# Altium footprint library CM3Board.PcbLib: 127 footprints (part 2 of 8)
Each footprint in its own frame and in the unit in brackets; x right, y up, seen from the top. Pads: shape width x height; smd on the part's side, far side on the other; paste and mask are expansions set on the pad; w line width, h text height; cw(c..) or ccw(c..) is an arc to the next point about the centre after c.
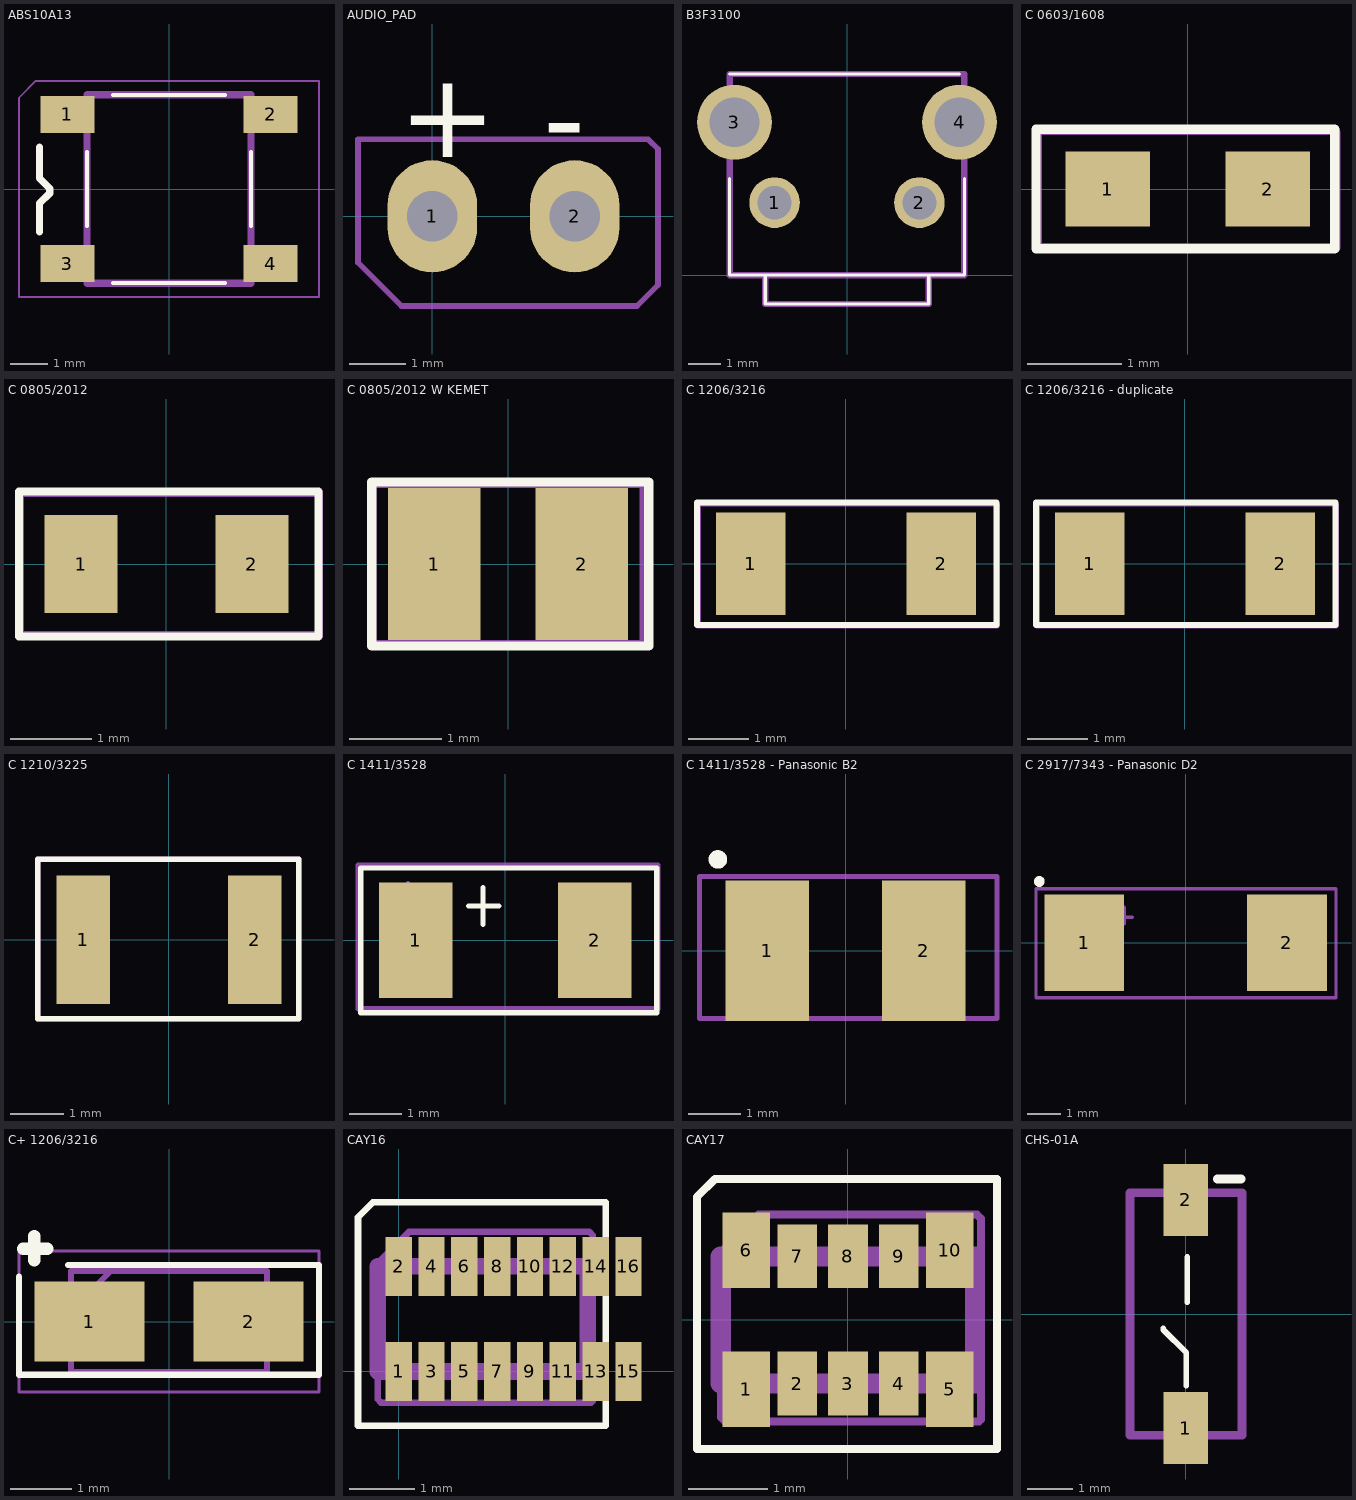
[diagram p1: the footprints below, top view; thin cyan lines are the x and y axes]

## ABS10A13 [mm]
pads (4):
  rect 1.45x1 smd: 1(-2.725,2) 2(2.725,2) 3(-2.725,-2) 4(2.725,-2)
Top Overlay:
  lines w0.1: -2.2,-1 -2.2,1 ; -1.5,-2.525 1.5,-2.525 ; -1.5,2.525 1.5,2.525 ; 2.2,-1 2.2,1
  lines w0.2: -3.475,-1.15 -3.475,-0.387 -3.2,-0.113 -3.2,0.013 -3.475,0.288 -3.475,1.125
Mechanical 13:
  lines w0.2: -2.2,-2.525 2.2,-2.525 2.2,2.525 -2.2,2.525 -2.2,-2.525
Mechanical 29:
  lines w0.05: -4.025,-2.9 -4.025,2.45 -3.575,2.9 4.025,2.9 4.025,-2.9 -4.025,-2.9
  text ".Designator" at -0.75,-0.025 h1

## AUDIO_PAD [mm]
pads (2):
  oval 1.6x2 hole 0.9: 1(0,0) 2(2.54,0)
Top Overlay:
  text "-" at 1.975,1 h1.52
  text "+" at -0.6,1.05 h1.52
Mechanical 29:
  lines w0.1: -1.325,-0.825 -1.325,1.375 3.85,1.375 4.025,1.2 4.025,-1.225 3.65,-1.6 -0.55,-1.6 -1.325,-0.825
  text ".Designator" at 0.425,-0.375 h1

## B3F3100 [mm]
pads (4):
  round 1.575 hole 1.05: 1(-2.25,2.25) 2(2.25,2.25)
  round 2.325 hole 1.55: 3(-3.5,4.75) 4(3.5,4.75)
Top Overlay:
  lines w0.1: -3.65,3 -3.65,0 3.65,0 3.65,3 ; -3.65,6.25 3.5,6.25 ; -2.54,0 -2.54,-0.9 2.54,-0.9 2.54,0
Mechanical 29:
  lines w0.2: -2.54,0 -2.54,-0.9 2.25,-0.9 2.54,-0.9 2.54,0 ; -3.65,0 -3.65,6.25 3.65,6.25 3.65,0 -3.65,0
  text ".Designator" at -1.016,2.286 h1
3D body "B3F-3100.stp": height 7.4, standoff -3.5, extent -4.223,-0.889 4.477,6.261

## C 0603/1608 [mm]
pads (2):
  rect 0.9x0.8 smd: 1(-0.85,0) 2(0.85,0)
Top Overlay:
  lines w0.1: -1.612,-0.635 1.563,-0.635 1.563,0.635 -1.612,0.635 -1.612,-0.635
Mechanical 29:
  lines w0.1: -1.6,-0.625 1.575,-0.625 1.575,0.6 1.55,0.625 -1.6,0.625 -1.6,-0.625
  text ".Designator" at -1.4,-0.4 h0.8
3D body: height 0.64, standoff 0, extent 0.85,-0.4 1.3,0.4
3D body: height 0.64, standoff 0, extent -1.3,-0.4 -0.85,0.4
3D body: height 0.64, standoff 0, extent -0.85,-0.4 0.85,0.4

## C 0805/2012 [mm]
pads (2):
  rect 0.9x1.2 smd: 1(-1.05,0) 2(1.05,0)
Top Overlay:
  lines w0.1: -1.812,-0.889 -1.812,0.889 1.871,0.889 1.871,-0.889 -1.812,-0.889
Mechanical 29:
  lines w0.1: -1.8,-0.875 -1.8,0.85 -1.775,0.875 1.875,0.875 1.875,-0.875 -1.8,-0.875
  text ".Designator" at -1.675,-0.55 h1
3D body: height 0.64, standoff 0, extent 1.1,-0.6 1.5,0.6
3D body: height 0.64, standoff 0, extent -1.5,-0.6 -1.05,0.6
3D body: height 0.64, standoff 0, extent -1.05,-0.6 1.1,0.6

## C 0805/2012 W KEMET [mm] "C0805C103K5RACTU"
pads (2):
  rect 1x1.65 smd: 1(-0.8,0) 2(0.8,0)
Top Overlay:
  lines w0.1: -1.475,-0.889 -1.475,0.889 1.525,0.889 1.525,-0.889 -1.475,-0.889
Mechanical 29:
  lines w0.1: -1.475,-0.875 -1.475,0.875 ; -1.475,-0.875 -1.475,0.875 ; -1.475,-0.875 1.475,-0.875 1.475,0.875 -1.475,0.875
  text ".Designator" at -1.15,-0.6 h1
3D body "C0805C103K5RACTU.step": height 0.88, standoff 0, extent -1.1,-0.775 1.1,0.675

## C 1206/3216 [mm]
pads (2):
  rect 1.15x1.7 smd: 1(-1.575,0) 2(1.575,0)
Top Overlay:
  lines w0.1: -2.464,-1.016 -2.464,1.016 2.489,1.016 2.489,-1.016 -2.464,-1.016
Mechanical 29:
  lines w0.1: -2.45,-1.025 -2.45,1 2.475,1 2.5,0.975 2.5,-1.025 -2.425,-1.025 -2.45,-1.025
  text ".Designator" at -2.225,-0.825 h1
3D body: height 0.64, standoff 0, extent -1.55,-0.85 1.65,0.85
3D body: height 0.64, standoff 0, extent -2.15,-0.85 -1.55,0.85
3D body: height 0.64, standoff 0, extent 1.65,-0.85 2.15,0.85

## C 1206/3216 - duplicate [mm]
pads (2):
  rect 1.15x1.7 smd: 1(-1.575,0) 2(1.575,0)
Top Overlay:
  lines w0.1: -2.464,-1.016 -2.464,1.016 2.489,1.016 2.489,-1.016 -2.464,-1.016
Mechanical 29:
  lines w0.1: -2.45,-1.025 -2.45,1 2.475,1 2.5,0.975 2.5,-1.025 -2.425,-1.025 -2.45,-1.025
  text ".Designator" at -2.225,-0.825 h1
3D body: height 0.64, standoff 0, extent -1.55,-0.85 1.65,0.85
3D body: height 0.64, standoff 0, extent -2.15,-0.85 -1.55,0.85
3D body: height 0.64, standoff 0, extent 1.65,-0.85 2.15,0.85

## C 1210/3225 [mm]
pads (2):
  rect 1x2.4 smd: 1(-1.6,0) 2(1.6,0)
Top Overlay:
  lines w0.1: -2.45,-1.475 2.425,-1.475 2.425,1.5 -2.45,1.5 -2.45,-1.475
Mechanical 29:
  lines w0.1: -2.45,-1.475 2.425,-1.475 2.425,1.5 -2.45,1.5 -2.45,-1.475
  text ".Designator" at -2.175,-0.9 h1
3D body: height 0.64, standoff 0, extent -2.1,-1.2 -1.575,1.2
3D body: height 0.64, standoff 0, extent 1.625,-1.2 2.1,1.2
3D body: height 0.64, standoff 0, extent -1.575,-1.2 1.625,1.2

## C 1411/3528 [mm]
pads (2):
  rect 1.4x2.2 smd: 1(-1.7,0) 2(1.7,0)
Top Overlay:
  lines w0.1: -0.7,0.65 -0.125,0.65 ; -0.425,0.3 -0.425,1 ; -2.75,-1.375 -2.75,1.375 2.875,1.375 2.875,-1.375 -2.75,-1.375
Mechanical 29:
  lines w0.1: -2.05,0.775 -1.6,0.775 ; -1.85,0.575 -1.85,1.075 ; -2.8,-1.3 -2.8,1.425 2.9,1.425 2.9,-1.3 -2.8,-1.3
  text ".Designator" at -1.55,-0.5 h1
3D body "T520B227M006ATE045.step": height 2.11, standoff 0.01, extent -1.875,-1.525 1.825,1.475

## C 1411/3528 - Panasonic B2 [mm]
pads (2):
  rect 1.6x2.7 smd: 1(-1.5,0) 2(1.5,0)
Top Overlay:
  circle w0.254: c-2.45,1.75 r0.05
Mechanical 29:
  lines w0.1: -2.05,0.775 -1.6,0.775 ; -1.85,0.575 -1.85,1.075 ; -2.8,-1.3 2.9,-1.3 2.9,1.425 -2.8,1.425 -2.8,-1.3
  text ".Designator" at -1.55,-0.5 h1
3D body "T520B227M006ATE045.step": height 2.11, standoff 0.01, extent -1.875,-1.525 1.825,1.475

## C 2917/7343 - Panasonic D2 [mm]
pads (2):
  rect 2.4x2.9 smd: 1(-3.05,0) 2(3.05,0)
Top Overlay:
  circle w0.254: c-4.4,1.85 r0.035
Mechanical 29:
  lines w0.1: -2.05,0.775 -1.6,0.775 ; -1.85,0.575 -1.85,1.075 ; -4.5,-1.65 4.525,-1.65 4.525,1.625 -4.5,1.625 -4.5,-1.65
  text ".Designator" at -1.55,-0.5 h1
3D body: height 0.64, standoff 0, extent -3.95,-1.4 -2.475,1.4
3D body: height 0.64, standoff 0, extent -2.475,-1.4 3.025,1.4
3D body: height 0.64, standoff 0, extent 3.031,-1.4 3.969,1.4

## C+ 1206/3216 [mm]
pads (2):
  rect 1.8x1.3 smd: 1(-1.3,0) 2(1.3,0)
Top Overlay:
  lines w0.1: -2.45,0.73 -2.45,-0.87 2.45,-0.87 2.45,0.92 -1.65,0.92
  lines w0.2: -2.385,1.19 -1.99,1.19 ; -2.2,1 -2.2,1.395
Mechanical 13:
  lines w0.1: -1.6,0.175 -0.95,0.825 ; -1.6,-0.825 -1.6,0.825 1.6,0.825 1.6,-0.825 -1.6,-0.825
Mechanical 29:
  lines w0.05: -2.45,-1.15 -2.45,1.15 2.45,1.15 2.45,-1.15 -2.45,-1.15
  text ".Designator" at -2.41,-0.66 h1
3D body "TAJA106M006RNJ.stp": height 1.8, standoff 0, extent -1.6,-0.825 1.6,0.825

## CAY16 [mm]
pads (16):
  rect 0.4x0.9 smd: 1(0,0) 2(0,1.6) 3(0.5,0) 4(0.5,1.6) 5(1,0) 6(1,1.6) 7(1.5,0) 8(1.5,1.6) 9(2,0) 10(2,1.6) 11(2.5,0) 12(2.5,1.6) 13(3,0) 14(3,1.6) 15(3.5,0) 16(3.5,1.6)
Top Overlay:
  lines w0.1: -0.62,-0.825 -0.62,2.35 -0.395,2.575 3.155,2.575 3.155,-0.825 -0.62,-0.825
Mechanical 13:
  lines w0.254: -0.32,0 -0.32,1.6 2.88,1.6 2.88,0 -0.32,0
Mechanical 29:
  lines w0.1: 0.205,2.125 0.155,2.125 ; 0.155,2.125 -0.32,1.65 -0.32,-0.425 -0.27,-0.475 2.93,-0.475 2.955,-0.45 2.955,2.075 2.905,2.125 0.155,2.125
  text ".Designator" at 0.605,0.6 h1
3D body "CAY17-472JALF.stp": height 0.51, standoff 0.01, extent -0.32,0 2.88,1.6

## CAY17 [mm]
pads (10):
  rect 0.6x0.95 smd: 1(-1.28,-0.875) 5(1.28,-0.875) 6(-1.28,0.875) 10(1.28,0.875)
  rect 0.5x0.8 smd: 2(-0.64,-0.8) 3(0,-0.8) 4(0.64,-0.8) 7(-0.64,0.8) 8(0,0.8) 9(0.64,0.8)
Top Overlay:
  lines w0.1: -1.9,-1.625 1.875,-1.625 1.875,1.775 -1.675,1.775 -1.9,1.55 -1.9,-1.625
Mechanical 13:
  lines w0.254: -1.6,-0.8 1.6,-0.8 1.6,0.8 -1.6,0.8 -1.6,-0.8
Mechanical 29:
  lines w0.1: -1.075,1.325 -1.125,1.325 ; -1.125,1.325 1.625,1.325 1.675,1.275 1.675,-1.25 1.65,-1.275 -1.55,-1.275 -1.6,-1.225 -1.6,0.85 -1.125,1.325
  text ".Designator" at -0.675,-0.2 h1
3D body "CAY17-472JALF.stp": height 0.51, standoff 0.01, extent -1.6,-0.8 1.6,0.8

## CHS-01A [mm]
pads (2):
  rect 1x1.6 smd: 1(0,-2.54) 2(0,2.54)
Top Overlay:
  lines w0.127: -0.5,-0.32 -0.5,-0.35 0.01,-0.86 0.01,-1.6 ; 0.03,0.26 0.03,1.27
  lines w0.2: 0.71,3.01 1.23,3.01
Mechanical 29:
  lines w0.2: -1.24,-2.7 -1.24,2.7 1.25,2.7 1.25,-2.7 -1.24,-2.7
  text ".Designator" at 0.57,-2.04 h1
3D body "CHS-01A.stp": height 2.42, standoff -0.1, extent -1.3,-2.85 1.2,2.75